# Altium footprint library Summer_Studio.PcbLib: 44 footprints (part 3 of 3)
Each footprint in its own frame and in the unit in brackets; x right, y up, seen from the top. Pads: shape width x height; smd on the part's side, far side on the other; paste and mask are expansions set on the pad; w line width, h text height; cw(c..) or ccw(c..) is an arc to the next point about the centre after c.
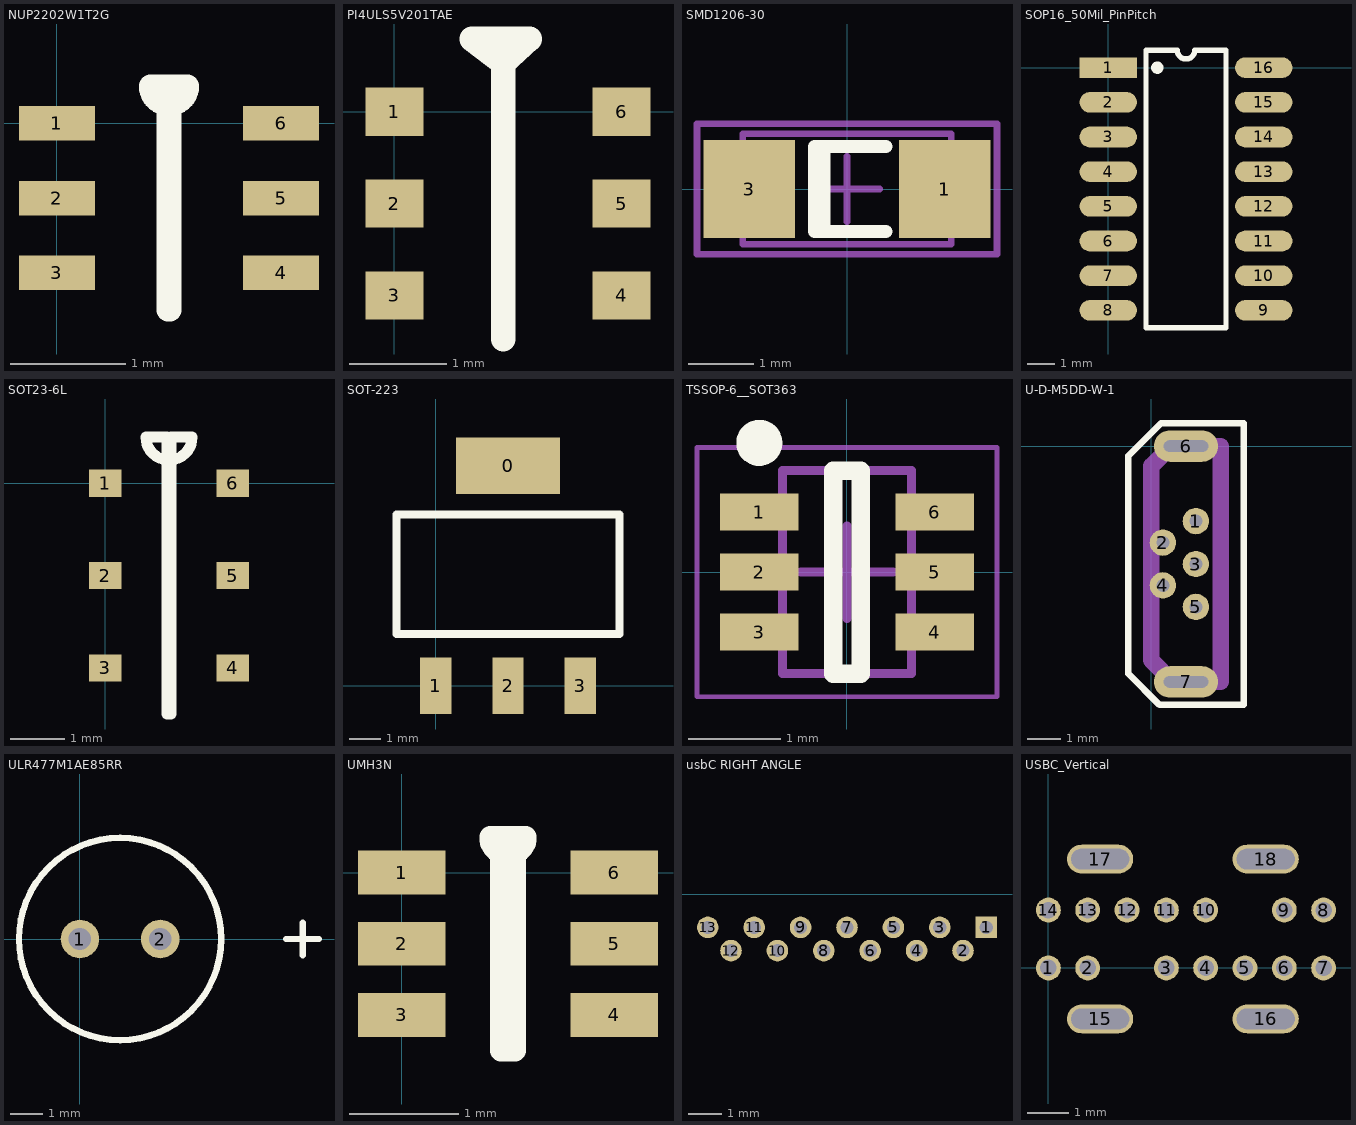
[diagram p2: the footprints below, top view; thin cyan lines are the x and y axes]

## NUP2202W1T2G [mm]
pads (6):
  rect 0.66x0.3 smd: 1(0,0) 2(0,-0.65) 3(0,-1.3) 4(1.95,-1.3) 5(1.95,-0.65) 6(1.95,0)
Top Overlay:
  lines w0.2: 0.813,0.325 ccw(c0.975,0.325) 1.137,0.325 0.965,0.325 0.965,-1.625 0.985,-1.625 0.985,0.325 0.813,0.325

## PI4ULS5V201TAE [mm]
pads (6):
  rect 0.6x0.5 smd: 1(0,0) 2(0,-0.95) 3(0,-1.9) 4(2.35,-1.9) 5(2.35,-0.95) 6(2.35,0)
Top Overlay:
  lines w0.254: 1.125,-2.35 1.125,0.5 ; 1.125,0.5 1.4,0.75 0.8,0.75 1.125,0.5

## SMD1206-30 [mm] "Chip, 2-Leads, Body 3.2x1.6mm, IPC Medium Density"
height 0.69
pads (2):
  rect 1.4x1.5 smd: 1(1.5,0) 3(-1.5,0)
Top Overlay:
  rectangle: -0.458,-0.665 -0.254,0.635
  lines w0.2: 0.6,-0.65 -0.5,-0.65 -0.5,0.65 0.6,0.65
Mechanical 13:
  lines w0.1: -1.6,-0.85 -1.6,0.85 1.6,0.85 1.6,-0.85 -1.6,-0.85
Mechanical 15:
  lines w0.1: -0.5,0 0.5,0 ; 0,-0.5 0,0.5 ; -2.3,-1 -2.3,1 2.3,1 2.3,-1 -2.3,-1
3D body "WL-SMCW_1206_LED.stp": height 0.68, standoff 0, extent -1.6,-0.8 1.6,0.8

## SOP16_50Mil_PinPitch [mm]
pads (16):
  rect 2.1x0.76 smd: 1(0,0)
  oval 2.1x0.76 smd: 2(0,-1.27) 3(0,-2.54) 4(0,-3.81) 5(0,-5.08) 6(0,-6.35) 7(0,-7.62) 8(0,-8.89) 9(5.7,-8.89) 10(5.7,-7.62) 11(5.7,-6.35) 12(5.7,-5.08) 13(5.7,-3.81) 14(5.7,-2.54) 15(5.7,-1.27) 16(5.7,0)
Top Overlay:
  circle w0.254: c1.8,0 r0.1
  lines w0.2: 1.385,-9.525 1.385,0.635 2.532,0.635 ccw(c2.85,0.635) 3.167,0.635 4.315,0.635 4.315,-9.525 1.385,-9.525
3D body: height 3.5, standoff 0, extent 0.8,-9.55 4.9,0.75

## SOT23-6L [mm]
pads (6):
  rect 0.6x0.5 smd: 1(0,0) 2(0,-1.7) 3(0,-3.4) 4(2.35,-3.4) 5(2.35,-1.7) 6(2.35,0)
Top Overlay:
  lines w0.2: 0.75,0.85 ccw(c1.175,0.85) 1.6,0.85 1.215,0.85 1.215,-4.25 1.135,-4.25 1.135,0.85 0.75,0.85

## SOT-223 [mm]
pads (4):
  rect 3.3x1.8 smd: 0(2.3,7)
  rect 1x1.8 smd: 1(0,0) 2(2.3,0) 3(4.6,0)
Top Overlay:
  lines w0.254: -1.25,1.645 5.85,1.645 5.85,5.455 -1.25,5.455 -1.25,1.645

## TSSOP-6__SOT363 [mm] "SOT363, 6-Leads, Body 2x1.3mm, Pitch 0.65mm, Lead Span 2.1mm, IPC Medium Density"
height 1.1
pads (6):
  rect 0.85x0.4 smd: 1(-0.95,0.65) 2(-0.95,0) 3(-0.95,-0.65) 4(0.95,-0.65) 5(0.95,0) 6(0.95,0.65)
Top Overlay:
  circle w0.25: c-0.95,1.4 r0.125
  lines w0.2: -0.15,-1.1 -0.15,1.1 0.15,1.1 0.15,-1.1 -0.15,-1.1
Mechanical 13:
  lines w0.1: -0.7,-1.1 0.7,-1.1 0.7,1.1 -0.7,1.1 -0.7,-1.1
Mechanical 15:
  lines w0.05: -1.625,-1.35 1.625,-1.35 1.625,1.35 -1.625,1.35 -1.625,-1.35
  lines w0.1: -0.5,0 0.5,0 ; 0,-0.5 0,0.5
3D body: height 1.1, standoff 0, extent -0.7,-1.1 0.7,1.1

## U-D-M5DD-W-1 [mm]
pads (7):
  round 0.8 hole 0.4: 1(1.35,-2.275) 2(0.35,-2.925) 3(1.35,-3.575) 4(0.35,-4.225) 5(1.35,-4.875)
  oval 1.95x0.95 hole 0.35 slot 1.35 at 0 deg: 6(1.05,0) 7(1.05,-7.15)
Top Overlay:
  lines w0.2: -0.7,-6.9 -0.7,-0.3 0.3,0.7 2.8,0.7 2.8,-7.85 0.25,-7.85 -0.7,-6.9
Mechanical 1:
  lines w0.5: 0,-6.5 0.65,-7.15 2.1,-7.15 2.1,0 0.6,0 0,-0.6 0,-6.5
3D body: height 1.6, standoff 0, extent 2.35,0.25 2.35,0.25
3D body: height 5.05, standoff 0, extent -0.25,-7.4 2.35,0.25

## ULR477M1AE85RR [mm]
height 8.5
pads (2):
  round 1.2 hole 0.7: 1(0,0) 2(2.5,0)
Top Overlay:
  circle w0.2: c1.25,0 r3.15
  lines w0.2: 6.432,0 7.448,0 ; 6.94,-0.508 6.94,0.508

## UMH3N [mm] "Dual Digital Transistors (NPN+NPN)"
pads (6):
  rect 0.8x0.4 smd: 1(0,0) 2(0,-0.65) 3(0,-1.3) 4(1.94,-1.3) 5(1.94,-0.65) 6(1.94,0)
Top Overlay:
  lines w0.2: 0.808,0.325 ccw(c0.97,0.325) 1.132,0.325 0.905,0.325 0.905,-1.625 1.035,-1.625 1.035,0.325 0.808,0.325

## usbC RIGHT ANGLE [mm]
pads (13):
  rect 0.65x0.65 hole 0.4: 1(11.3,-1)
  round 0.65 hole 0.4: 2(10.6,-1.7) 3(9.9,-1) 4(9.2,-1.7) 5(8.5,-1) 6(7.8,-1.7) 7(7.1,-1) 8(6.4,-1.7) 9(5.7,-1) 10(5,-1.7) 11(4.3,-1) 12(3.6,-1.7) 13(2.9,-1)

## USBC_Vertical [mm]
pads (18):
  round 0.6 hole 0.4: 1(0,0) 2(0.95,0) 3(2.85,0) 4(3.8,0) 5(4.75,0) 6(5.7,0) 7(6.65,0) 8(6.65,1.4) 9(5.7,1.4) 10(3.8,1.4) 11(2.85,1.4) 12(1.9,1.4) 13(0.95,1.4) 14(0,1.4)
  oval 1.6x0.7 hole 0.5 slot 1.4 at 0 deg: 15(1.25,-1.23) 16(5.25,-1.23) 17(1.25,2.63) 18(5.25,2.63)